# Altium footprint library LAN Transformer.PcbLib: 66 footprints (part 3 of 5)
Each footprint in its own frame and in the unit in brackets; x right, y up, seen from the top. Pads: shape width x height; smd on the part's side, far side on the other; paste and mask are expansions set on the pad; w line width, h text height; cw(c..) or ccw(c..) is an arc to the next point about the centre after c.
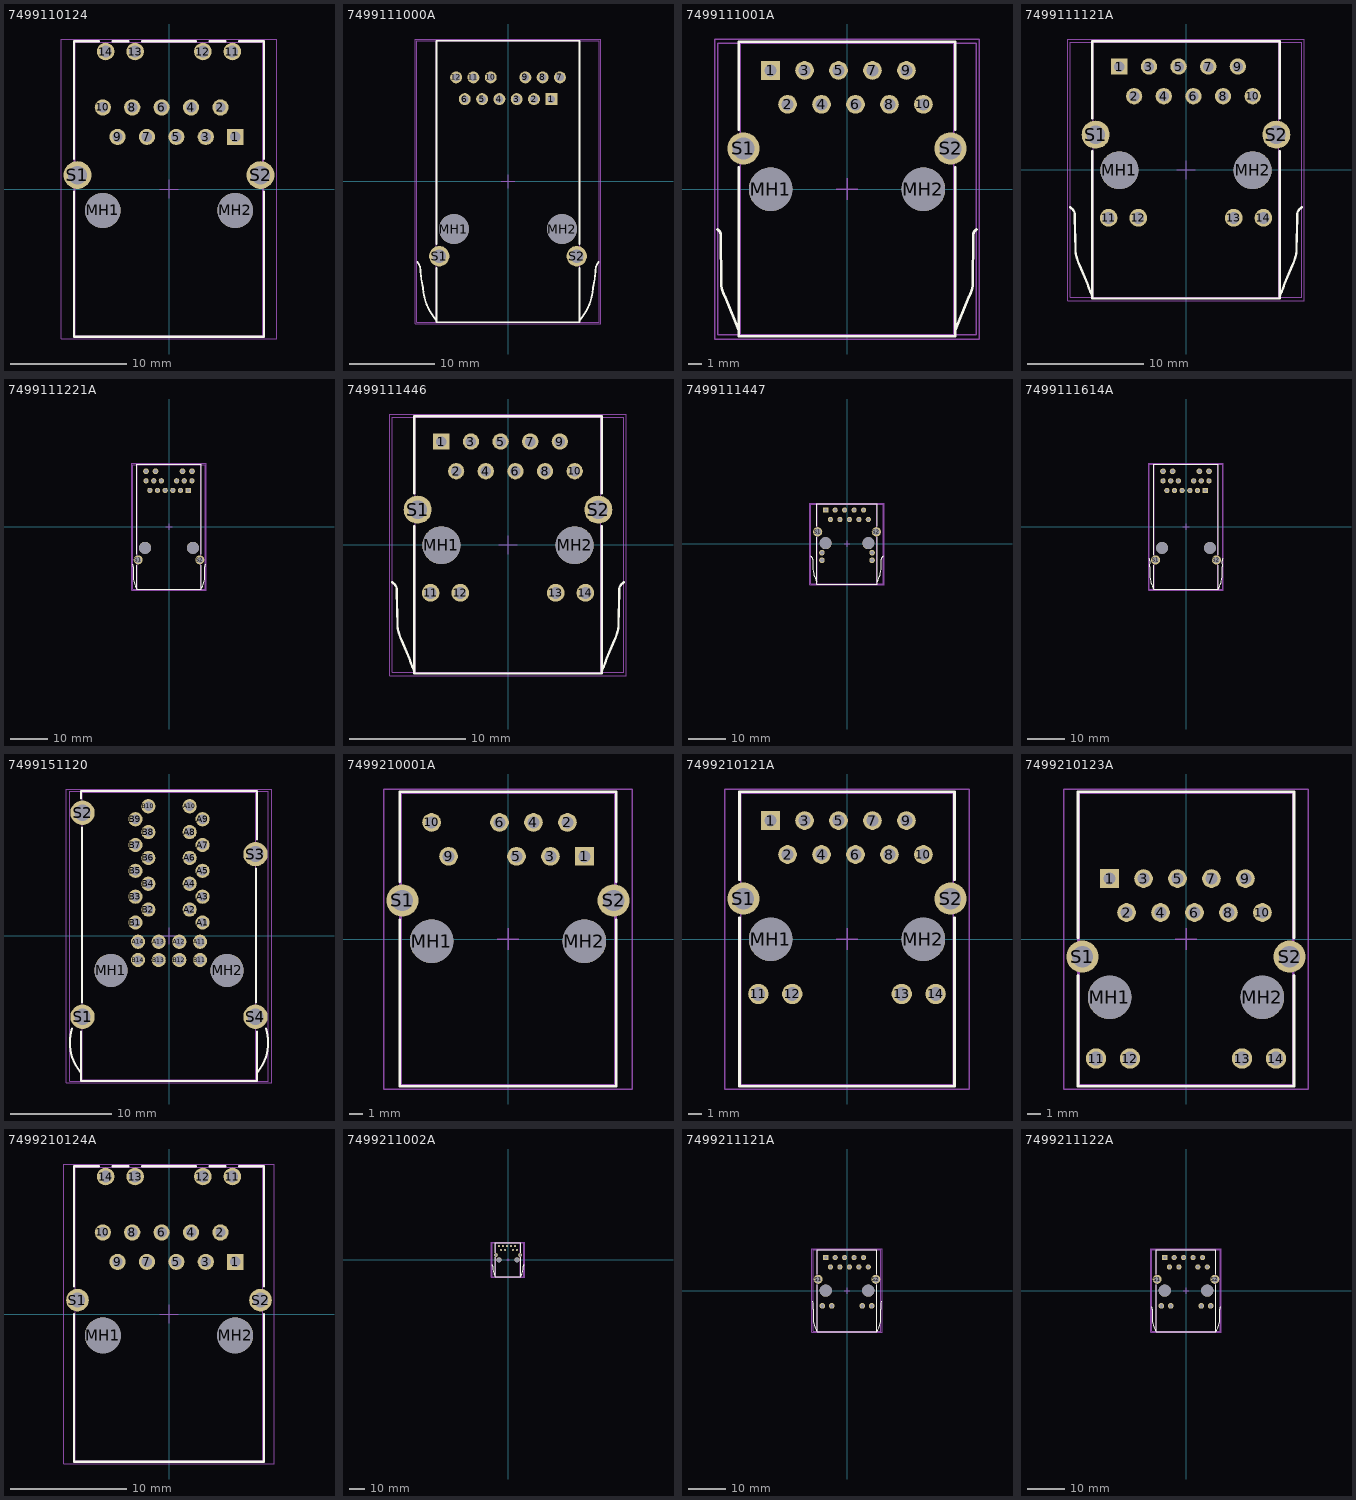
[diagram p2: the footprints below, top view; thin cyan lines are the x and y axes]

## 7499110124 [mm] "LAN Transformer, body 25.3x16.2mm"
height 13.5
pads (18):
  rect 1.4x1.4 hole 0.9: 1(5.715,4.5)
  round 1.4 hole 0.9: 2(4.445,7.04) 3(3.175,4.5) 4(1.905,7.04) 5(0.635,4.5) 6(-0.635,7.04) 7(-1.905,4.5) 8(-3.175,7.04) 9(-4.445,4.5) 10(-5.715,7.04)
  round 1.52 hole 1.02: 11(5.465,11.87) 12(2.925,11.87) 13(-2.925,11.87) 14(-5.465,11.87)
  round 3.05 hole 3.05 unplated: MH1(-5.715,-1.85) MH2(5.715,-1.85)
  round 2.4 hole 1.6: S1(-7.9,1.2) S2(7.9,1.2)
Top Overlay:
  lines w0.2: -8.2,-0.21 -8.2,-12.75 8.2,-12.75 8.2,-0.21 ; -8.2,2.62 -8.2,12.75 -6.06,12.75 ; -4.86,12.75 -3.53,12.75 ; -2.32,12.75 2.33,12.75 ; 3.53,12.75 4.86,12.75 ; 6.06,12.75 8.2,12.75 8.2,2.62
Mechanical 11:
  lines w0.1: -8.1,-12.65 8.1,-12.65 8.1,12.65 -8.1,12.65 -8.1,-12.65
  text ".Designator" at 0,0 h1
Mechanical 13:
  lines w0.1: -8.2,-12.65 -8.2,12.65 8.2,12.65 8.2,-12.65 -8.2,-12.65
Mechanical 15:
  lines w0.1: -0.8,0 0.8,0 ; 0,-0.8 0,0.8 ; -9.3,-12.95 -9.3,12.95 9.3,12.95 9.3,-12.95 -9.3,-12.95
3D body "7499110124.stp": height 13.6, standoff -3.45, extent -8.2,-12.65 8.2,12.65

## 7499111000A [mm] "LAN Transformer, body 33.02x16.79mm"
height 15.79
pads (16):
  rect 1.4x1.4 hole 0.89: 1(5.08,9.66)
  round 1.4 hole 0.89: 2(3.05,9.66) 3(1.02,9.66) 4(-1.01,9.66) 5(-3.04,9.66) 6(-5.07,9.66) 7(6.095,12.2) 8(4.065,12.2) 9(2.035,12.2) 10(-2.025,12.2) 11(-4.055,12.2) 12(-6.085,12.2)
  round 3.5 hole 3.5 unplated: MH1(-6.35,-5.58) MH2(6.35,-5.58)
  round 2.4 hole 1.57: S1(-8.065,-8.76) S2(8.065,-8.76)
Top Overlay:
  lines w0.2: -10.615,-9.424 cw(c-12,-10.49) -10.255,-10.589 ; -10.252,-10.486 -10.176,-11.433 -9.962,-12.498 ccw(c-3.6,-12.1) -8.395,-16.3 ; -8.395,-10.15 -8.395,-16.51 8.395,-16.51 8.395,-10.15 ; -8.395,-7.37 -8.395,16.51 8.395,16.51 8.395,-7.37 ; 8.395,-16.3 ccw(c3.6,-12.1) 9.962,-12.498 10.176,-11.433 10.252,-10.486 ; 10.255,-10.589 cw(c12,-10.49) 10.615,-9.424
Mechanical 11:
  lines w0.1: -8.395,-16.51 8.395,-16.51 8.395,16.51 -8.395,16.51 -8.395,-16.51
  text ".Designator" at 0,0 h1
Mechanical 13:
  lines w0.1: -10.695,-16.51 -10.695,16.51 10.695,16.51 10.695,-16.51 -10.695,-16.51
Mechanical 15:
  lines w0.1: -0.8,0 0.8,0 ; 0,-0.8 0,0.8 ; -10.895,-16.71 -10.895,16.71 10.895,16.71 10.895,-16.71 -10.895,-16.71
3D body "7499111000A.stp": height 16.85, standoff -3.45, extent -10.695,-16.51 10.695,16.51

## 7499111001A [mm] "LAN Transformer, body 21.84x16mm"
height 13.95
pads (14):
  rect 1.4x1.4 hole 0.89: 1(-5.715,8.87)
  round 1.4 hole 0.89: 2(-4.445,6.33) 3(-3.175,8.87) 4(-1.905,6.33) 5(-0.635,8.87) 6(0.635,6.33) 7(1.905,8.87) 8(3.175,6.33) 9(4.445,8.87) 10(5.715,6.33)
  round 3.25 hole 3.25 unplated: MH1(-5.715,-0.02) MH2(5.715,-0.02)
  round 2.4 hole 1.63: S1(-7.745,3.03) S2(7.745,3.03)
Top Overlay:
  lines w0.2: -9.683,-3.029 cw(c-9.92,-3.45) -9.437,-3.45 ; -9.44,-3.4 -9.398,-7.215 ; -9.405,-7.216 ccw(c-6.777,-6.794) -9.108,-8.079 -8.104,-10.562 ; -8.1,1.63 -8.1,-11.02 8.1,-11.02 8.1,1.63 ; -8.1,4.44 -8.1,11.02 8.1,11.02 8.1,4.44 ; 8.104,-10.562 9.108,-8.079 ccw(c6.777,-6.794) 9.405,-7.216 ; 9.398,-7.215 9.44,-3.4 ; 9.437,-3.45 cw(c9.92,-3.45) 9.683,-3.029
Mechanical 11:
  lines w0.1: -8,-10.92 8,-10.92 8,10.92 -8,10.92 -8,-10.92
  text ".Designator" at 0,0 h1
Mechanical 13:
  lines w0.1: -9.671,-10.92 -9.671,10.92 9.671,10.92 9.671,-10.92 -9.671,-10.92
Mechanical 15:
  lines w0.1: -0.8,0 0.8,0 ; 0,-0.8 0,0.8 ; -9.9,-11.22 -9.9,11.22 9.9,11.22 9.9,-11.22 -9.9,-11.22
3D body "7499111001A.stp": height 15.8, standoff -3.66, extent -9.671,-10.94 9.671,10.9

## 7499111121A [mm] "LAN Transformer, body 21.84x15.88mm"
height 13.95
pads (18):
  rect 1.4x1.4 hole 0.9: 1(-5.715,8.86)
  round 1.4 hole 0.9: 2(-4.445,6.32) 3(-3.175,8.86) 4(-1.905,6.32) 5(-0.635,8.86) 6(0.635,6.32) 7(1.905,8.86) 8(3.175,6.32) 9(4.445,8.86) 10(5.715,6.32)
  round 1.52 hole 1.02: 11(-6.63,-4.11) 12(-4.09,-4.11) 13(4.09,-4.11) 14(6.63,-4.11)
  round 3.25 hole 3.25 unplated: MH1(-5.715,-0.03) MH2(5.715,-0.03)
  round 2.4 hole 1.6: S1(-7.745,3.02) S2(7.745,3.02)
Top Overlay:
  lines w0.2: -9.93,-3.209 cw(c-10.325,-3.901) -9.528,-3.901 -9.47,-7 ccw(c-8.2,-7) -9.37,-7.494 ccw(c-6.9,-7) -9.112,-8.205 -8.445,-9.764 ccw(c-2.1,-7.88) -8.04,-10.8 ; -8.04,1.6 -8.04,-11.02 8.04,-11.02 8.04,1.6 ; -8.04,4.44 -8.04,11.02 8.04,11.02 8.04,4.44 ; 8.04,-10.8 ccw(c2.1,-7.88) 8.445,-9.764 9.112,-8.205 ccw(c6.9,-7) 9.37,-7.494 ccw(c8.2,-7) 9.47,-7 9.528,-3.901 cw(c10.325,-3.901) 9.93,-3.209
Mechanical 11:
  lines w0.1: -7.94,-10.92 -7.94,10.92 7.94,10.92 7.94,-10.92 -7.94,-10.92
  text ".Designator" at 0,0 h1
Mechanical 13:
  lines w0.1: -9.923,-10.92 9.923,-10.92 9.923,10.92 -9.923,10.92 -9.923,-10.92
Mechanical 15:
  lines w0.1: -0.8,0 0.8,0 ; 0,-0.8 0,0.8 ; -10.13,-11.22 10.13,-11.22 10.13,11.22 -10.13,11.22 -10.13,-11.22
3D body "7499111121A.stp": height 16.01, standoff -3.57, extent -9.923,-10.92 9.923,10.92

## 7499111221A [mm] "LAN Transformer, body 33.02x16.79mm"
height 15.79
pads (20):
  rect 1.4x1.4 hole 0.89: 1(5.075,9.66)
  round 1.4 hole 0.89: 2(3.045,9.66) 3(1.015,9.66) 4(-1.015,9.66) 5(-3.045,9.66) 6(-5.075,9.66) 7(6.085,12.2) 8(4.055,12.2) 9(2.025,12.2) 10(-2.025,12.2) 11(-4.055,12.2) 12(-6.085,12.2)
  round 1.53 hole 1.03: 13(6.12,14.74) 14(3.58,14.74) 15(-3.58,14.74) 16(-6.12,14.74)
  round 3.2 hole 3.2 unplated: MH1(-6.35,-5.58) MH2(6.35,-5.58)
  round 2.4 hole 1.57: S1(-8.175,-8.76) S2(8.175,-8.76)
Top Overlay:
  lines w0.2: -9.664,-9.913 cw(c-10.775,-10.525) -9.508,-10.582 ccw(c-5.893,-11.022) -9.535,-11.052 ccw(c15.129,-11.88) -9.464,-13.924 ccw(c-1.045,-12.405) -8.495,-16.61 ; -8.495,-10.17 -8.495,-16.61 ; -8.495,-7.35 -8.495,16.61 8.495,16.61 8.495,-7.35 ; 8.495,-10.17 8.495,-16.61 ; 9.664,-9.913 ccw(c10.775,-10.525) 9.508,-10.582 cw(c5.893,-11.022) 9.535,-11.052 cw(c-15.129,-11.88) 9.464,-13.924 cw(c1.045,-12.405) 8.495,-16.61 ; -8.495,-16.61 8.495,-16.61
Mechanical 11:
  lines w0.1: -8.395,-16.51 8.395,-16.51 8.395,16.51 -8.395,16.51 -8.395,-16.51
  text ".Designator" at 0,0 h1
Mechanical 13:
  lines w0.1: -9.685,-16.51 -9.685,16.51 9.685,16.51 9.685,-16.51 -9.685,-16.51
Mechanical 15:
  lines w0.1: -0.8,0 0.8,0 ; 0,-0.8 0,0.8 ; -9.9,-16.81 9.9,-16.81 9.9,16.81 -9.9,16.81 -9.9,-16.81
3D body "7499111221A.stp": height 16.02, standoff -3.49, extent -9.685,-16.51 9.685,16.51

## 7499111446 [mm] "LAN Transformer, body 21.84x15.88mm"
height 13.95
pads (18):
  rect 1.4x1.4 hole 0.9: 1(-5.715,8.86)
  round 1.4 hole 0.9: 2(-4.445,6.32) 3(-3.175,8.86) 4(-1.905,6.32) 5(-0.635,8.86) 6(0.635,6.32) 7(1.905,8.86) 8(3.175,6.32) 9(4.445,8.86) 10(5.715,6.32)
  round 1.52 hole 1.02: 11(-6.63,-4.11) 12(-4.09,-4.11) 13(4.09,-4.11) 14(6.63,-4.11)
  round 3.25 hole 3.25 unplated: MH1(-5.715,-0.03) MH2(5.715,-0.03)
  round 2.4 hole 1.6: S1(-7.745,3.02) S2(7.745,3.02)
Top Overlay:
  lines w0.2: -9.93,-3.209 cw(c-10.325,-3.901) -9.528,-3.901 -9.47,-7 ccw(c-8.2,-7) -9.37,-7.494 ccw(c-6.9,-7) -9.112,-8.205 -8.445,-9.764 ccw(c-2.1,-7.88) -8.04,-10.8 ; -8.04,1.61 -8.04,-11.02 8.04,-11.02 8.04,1.61 ; -8.04,4.44 -8.04,11.02 8.04,11.02 8.04,4.44 ; 8.04,-10.8 ccw(c2.1,-7.88) 8.445,-9.764 9.112,-8.205 ccw(c6.9,-7) 9.37,-7.494 ccw(c8.2,-7) 9.47,-7 9.528,-3.901 cw(c10.325,-3.901) 9.93,-3.209
Mechanical 11:
  lines w0.1: -7.94,-10.92 -7.94,10.92 7.94,10.92 7.94,-10.92 -7.94,-10.92
  text ".Designator" at 0,0 h1
Mechanical 13:
  lines w0.1: -9.923,-10.92 9.923,-10.92 9.923,10.92 -9.923,10.92 -9.923,-10.92
Mechanical 15:
  lines w0.1: -0.8,0 0.8,0 ; 0,-0.8 0,0.8 ; -10.13,-11.22 -10.13,11.22 10.13,11.22 10.13,-11.22 -10.13,-11.22
3D body "7499111446.stp": height 16.01, standoff -3.52, extent -9.923,-10.92 9.923,10.92

## 7499111447 [mm] "LAN Transformer, body 21.3x16mm"
height 13.55
pads (18):
  rect 1.4x1.4 hole 0.89: 1(-5.715,9.09)
  round 1.4 hole 0.89: 2(-4.445,6.55) 3(-3.175,9.09) 4(-1.905,6.55) 5(-0.635,9.09) 6(0.635,6.55) 7(1.905,9.09) 8(3.175,6.55) 9(4.445,9.09) 10(5.715,6.55)
  round 1.52 hole 1.02: 11(-6.725,-2.34) 12(-6.725,-4.37) 13(6.725,-2.34) 14(6.725,-4.37)
  round 3.2 hole 3.2 unplated: MH1(-5.715,0.2) MH2(5.715,0.2)
  round 2.5 hole 1.7: S1(-7.875,3.25) S2(7.875,3.25)
Top Overlay:
  lines w0.2: -9.783,-3.331 cw(c-10,-4.2) -9.104,-4.2 ; -9.113,-4.072 ccw(c-5.498,-4.512) -9.14,-4.542 ccw(c15.524,-5.37) -9.069,-7.414 ccw(c-0.65,-5.895) -8.1,-10.1 ; -8.1,1.78 -8.1,-10.75 8.1,-10.75 8.1,1.78 ; -8.1,4.73 -8.1,10.75 8.1,10.75 8.1,4.73 ; 8.1,-10.1 ccw(c0.65,-5.895) 9.069,-7.414 ccw(c-15.524,-5.37) 9.14,-4.542 ccw(c5.498,-4.512) 9.113,-4.072 ; 9.104,-4.2 cw(c10,-4.2) 9.783,-3.331
Mechanical 11:
  lines w0.1: -8,-10.65 -8,10.65 8,10.65 8,-10.65 -8,-10.65
  text ".Designator" at 0,0 h1
Mechanical 13:
  lines w0.1: -9.724,-10.65 9.724,-10.65 9.724,10.65 -9.724,10.65 -9.724,-10.65
Mechanical 15:
  lines w0.1: -0.8,0 0.8,0 ; 0,-0.8 0,0.8 ; -10,-10.95 10,-10.95 10,10.95 -10,10.95 -10,-10.95
3D body "7499111447.stp": height 15.35, standoff -2.98, extent -9.724,-10.65 9.724,10.65

## 7499111614A [mm] "LAN Transformer, body 33.02x16.87mm"
height 13.87
pads (20):
  rect 1.4x1.4 hole 0.9: 1(5.075,9.62)
  round 1.4 hole 0.9: 2(3.045,9.62) 3(1.015,9.62) 4(-1.015,9.62) 5(-3.045,9.62) 6(-5.075,9.62) 7(6.085,12.16) 8(4.055,12.16) 9(2.025,12.16) 10(-2.025,12.16) 11(-4.055,12.16) 12(-6.085,12.16)
  round 1.52 hole 1.02: 13(6.09,14.7) 14(3.55,14.7) 15(-3.55,14.7) 16(-6.09,14.7)
  round 3.15 hole 3.15 unplated: MH1(-6.35,-5.62) MH2(6.35,-5.62)
  round 2.4 hole 1.6: S1(-8.065,-8.8) S2(8.065,-8.8)
Top Overlay:
  lines w0.2: -9.697,-8.501 cw(c-10.808,-9.113) -9.541,-9.17 -9.548,-10.582 ccw(c-5.933,-11.022) -9.575,-11.052 ccw(c15.089,-11.88) -9.504,-13.924 ccw(c-1.085,-12.405) -8.535,-16.61 ; -8.535,-10.18 -8.535,-16.61 ; -8.535,-7.42 -8.535,16.61 8.535,16.61 8.535,-7.42 ; 8.535,-10.18 8.535,-16.61 ; 9.697,-8.501 ccw(c10.808,-9.113) 9.541,-9.17 9.548,-10.582 cw(c5.933,-11.022) 9.575,-11.052 cw(c-15.089,-11.88) 9.504,-13.924 cw(c1.085,-12.405) 8.535,-16.61 ; -8.535,-16.61 8.535,-16.61
Mechanical 11:
  lines w0.1: -8.435,-16.51 -8.435,16.51 8.435,16.51 8.435,-16.51 -8.435,-16.51
  text ".Designator" at 0,0 h1
Mechanical 13:
  lines w0.1: -9.685,-16.51 9.685,-16.51 9.685,16.51 -9.685,16.51 -9.685,-16.51
Mechanical 15:
  lines w0.1: -0.8,0 0.8,0 ; 0,-0.8 0,0.8 ; -9.9,-16.81 -9.9,16.81 9.9,16.81 9.9,-16.81 -9.9,-16.81
3D body "7499111614A.stp": height 15.86, standoff -3.44, extent -9.685,-16.51 9.685,16.51

## 7499151120 [mm] "LAN Transformer, body 28.3x17.09mm"
height 25.25
pads (34):
  round 1.4 hole 0.9: A1(3.3,1.32) A2(2.03,2.59) A3(3.3,3.86) A4(2.03,5.13) A5(3.3,6.4) A6(2.03,7.67) A7(3.3,8.94) A8(2.03,10.21) A9(3.3,11.48) A10(2.03,12.75) A11(3.045,-0.57) A12(1.015,-0.57) A13(-1.015,-0.57) A14(-3.045,-0.57) B1(-3.3,1.32) B2(-2.03,2.59) B3(-3.3,3.86) B4(-2.03,5.13) B5(-3.3,6.4) B6(-2.03,7.67) B7(-3.3,8.94) B8(-2.03,10.21) B9(-3.3,11.48) B10(-2.03,12.75) B11(3.045,-2.37) B12(1.015,-2.37) B13(-1.015,-2.37) B14(-3.045,-2.37)
  round 3.25 hole 3.25 unplated: MH1(-5.715,-3.38) MH2(5.715,-3.38)
  round 2.4 hole 1.6: S1(-8.505,-7.95) S2(-8.505,12.11) S3(8.505,8.05) S4(8.505,-7.95)
Top Overlay:
  lines w0.2: -9.551,-9.089 ccw(c-5.155,-10.45) -8.645,-13.45 ; -8.645,-9.38 -8.645,-14.25 8.645,-14.25 8.645,-9.38 ; -8.645,13.54 -8.645,14.25 8.645,14.25 8.645,9.48 ; -8.545,-6.52 -8.545,10.67 ; 8.545,-6.52 8.545,6.62 ; 8.645,-13.45 ccw(c5.155,-10.45) 9.551,-9.089
Mechanical 11:
  lines w0.1: -8.545,-14.15 -8.545,14.15 8.545,14.15 8.545,-14.15 -8.545,-14.15
  text ".Designator" at 0,0 h1
Mechanical 13:
  lines w0.1: -9.744,-14.27 9.744,-14.27 9.744,14.231 -9.744,14.231 -9.744,-14.27
Mechanical 15:
  lines w0.1: -0.8,0 0.8,0 ; 0,-0.8 0,0.8 ; -10.1,-14.45 -10.1,14.45 10.1,14.45 10.1,-14.45 -10.1,-14.45
3D body "7499151120.stp": height 26.5, standoff -3.8, extent -9.744,-14.27 9.744,14.231

## 7499210001A [mm] "LAN Transformer, body 21.84x16mm"
height 13.74
pads (12):
  rect 1.4x1.4 hole 0.89: 1(5.715,6.18)
  round 1.4 hole 0.89: 2(4.445,8.72) 3(3.175,6.18) 4(1.905,8.72) 5(0.635,6.18) 6(-0.635,8.72) 9(-4.445,6.18) 10(-5.715,8.72)
  round 3.25 hole 3.25 unplated: MH1(-5.715,-0.17) MH2(5.715,-0.17)
  round 2.4 hole 1.6: S1(-7.9,2.88) S2(7.9,2.88)
Top Overlay:
  lines w0.2: -8.1,1.45 -8.1,-11.02 8.1,-11.02 8.1,1.45 ; -8.1,4.3 -8.1,11.02 8.1,11.02 8.1,4.3
Mechanical 11:
  lines w0.1: -8,-10.92 -8,10.92 8,10.92 8,-10.92 -8,-10.92
  text ".Designator" at 0,0 h1
Mechanical 13:
  lines w0.1: -8.1,-10.92 -8.1,10.92 8.1,10.92 8.1,-10.92 -8.1,-10.92
Mechanical 15:
  lines w0.1: -0.8,0 0.8,0 ; 0,-0.8 0,0.8 ; -9.3,-11.22 -9.3,11.22 9.3,11.22 9.3,-11.22 -9.3,-11.22
3D body "7499210001A.stp": height 13.87, standoff -2.86, extent -8.1,-10.92 8.1,10.92

## 7499210121A [mm] "LAN Transformer, body 21.84x15.88mm"
height 13.95
pads (18):
  rect 1.4x1.4 hole 0.9: 1(-5.715,8.86)
  round 1.4 hole 0.9: 2(-4.445,6.32) 3(-3.175,8.86) 4(-1.905,6.32) 5(-0.635,8.86) 6(0.635,6.32) 7(1.905,8.86) 8(3.175,6.32) 9(4.445,8.86) 10(5.715,6.32)
  round 1.52 hole 1.02: 11(-6.63,-4.11) 12(-4.09,-4.11) 13(4.09,-4.11) 14(6.63,-4.11)
  round 3.25 hole 3.25 unplated: MH1(-5.715,-0.03) MH2(5.715,-0.03)
  round 2.4 hole 1.6: S1(-7.745,3.02) S2(7.745,3.02)
Top Overlay:
  lines w0.2: -8.04,1.6 -8.04,-11.02 8.04,-11.02 8.04,1.6 ; -8.04,4.44 -8.04,11.02 8.04,11.02 8.04,4.44
Mechanical 11:
  lines w0.1: -7.94,-10.92 -7.94,10.92 7.94,10.92 7.94,-10.92 -7.94,-10.92
  text ".Designator" at 0,0 h1
Mechanical 13:
  lines w0.1: -7.94,-10.92 7.94,-10.92 7.94,10.92 -7.94,10.92 -7.94,-10.92
Mechanical 15:
  lines w0.1: -0.8,0 0.8,0 ; 0,-0.8 0,0.8 ; -9.145,-11.22 9.145,-11.22 9.145,11.22 -9.145,11.22 -9.145,-11.22
3D body "7499210121A.stp": height 14.08, standoff -4.05, extent -7.94,-10.92 7.94,10.92

## 7499210123A [mm] "LAN Transformer, body 21.84x15.95mm"
height 16.9
pads (18):
  rect 1.4x1.4 hole 0.9: 1(-5.715,4.52)
  round 1.4 hole 0.9: 2(-4.445,1.98) 3(-3.175,4.52) 4(-1.905,1.98) 5(-0.635,4.52) 6(0.635,1.98) 7(1.905,4.52) 8(3.175,1.98) 9(4.445,4.52) 10(5.715,1.98)
  round 1.52 hole 1.02: 11(-6.73,-8.94) 12(-4.19,-8.94) 13(4.19,-8.94) 14(6.73,-8.94)
  round 3.25 hole 3.25 unplated: MH1(-5.715,-4.37) MH2(5.715,-4.37)
  round 2.4 hole 1.6: S1(-7.745,-1.32) S2(7.745,-1.32)
Top Overlay:
  lines w0.2: -8.075,-2.73 -8.075,-11.02 8.075,-11.02 8.075,-2.73 ; -8.075,0.09 -8.075,11.02 8.075,11.02 8.075,0.09
Mechanical 11:
  lines w0.1: -7.975,-10.92 7.975,-10.92 7.975,10.92 -7.975,10.92 -7.975,-10.92
  text ".Designator" at 0,0 h1
Mechanical 13:
  lines w0.1: -8.1,-10.92 8.075,-10.92 8.075,10.92 -8.1,10.92 -8.1,-10.92
Mechanical 15:
  lines w0.1: -0.8,0 0.8,0 ; 0,-0.8 0,0.8 ; -9.145,-11.22 -9.145,11.22 9.145,11.22 9.145,-11.22 -9.145,-11.22
3D body "7499210123A.stp": height 16.87, standoff -3.32, extent -8.1,-10.92 8.1,10.92

## 7499210124A [mm] "LAN Transformer, body 25.3x16.2mm"
height 13.5
pads (18):
  rect 1.4x1.4 hole 0.9: 1(5.715,4.5)
  round 1.4 hole 0.9: 2(4.445,7.04) 3(3.175,4.5) 4(1.905,7.04) 5(0.635,4.5) 6(-0.635,7.04) 7(-1.905,4.5) 8(-3.175,7.04) 9(-4.445,4.5) 10(-5.715,7.04)
  round 1.52 hole 1.02: 11(5.465,11.87) 12(2.925,11.87) 13(-2.925,11.87) 14(-5.465,11.87)
  round 3.1 hole 3.1 unplated: MH1(-5.715,-1.85) MH2(5.715,-1.85)
  round 1.95 hole 1.3: S1(-7.9,1.2) S2(7.9,1.2)
Top Overlay:
  lines w0.2: -8.2,0 -8.2,-12.75 8.2,-12.75 8.2,0 ; -8.2,2.39 -8.2,12.75 -6.07,12.75 ; -4.86,12.75 -3.53,12.75 ; -2.31,12.75 2.32,12.75 ; 3.53,12.75 4.86,12.75 ; 6.07,12.75 8.2,12.75 8.2,2.39
Mechanical 11:
  lines w0.1: -8.1,-12.65 8.1,-12.65 8.1,12.65 -8.1,12.65 -8.1,-12.65
  text ".Designator" at 0,0 h1
Mechanical 13:
  lines w0.1: -8.1,-12.65 -8.1,12.65 8.1,12.65 8.1,-12.65 -8.1,-12.65
Mechanical 15:
  lines w0.1: -0.8,0 0.8,0 ; 0,-0.8 0,0.8 ; -9.075,-12.95 9.075,-12.95 9.075,12.95 -9.075,12.95 -9.075,-12.95
3D body "7499210124A.stp": height 13.65, standoff -3.34, extent -8.1,-12.65 8.1,12.65

## 7499211002A [mm] "LAN Transformer, body 21.84x15.88mm"
height 13.74
pads (13):
  rect 1.4x1.4 hole 0.9: 1(-5.715,8.86)
  round 1.4 hole 0.9: 2(-4.445,6.32) 3(-3.175,8.86) 4(-1.905,6.32) 5(-0.635,8.86) 7(1.905,8.86) 8(3.175,6.32) 9(4.445,8.86) 10(5.715,6.32)
  round 3.25 hole 3.25 unplated: MH1(-5.715,-0.03) MH2(5.715,-0.03)
  round 2.4 hole 1.6: S1(-7.74,3.02) S2(7.74,3.02)
Top Overlay:
  lines w0.2: -10.107,-3.368 cw(c-10.465,-3.995) -9.751,-4.096 ccw(c2.96,-5.12) -9.709,-6.573 ccw(c4.524,-3.711) -8.849,-9.362 cw(c-48.855,-34.82) -8.251,-10.328 cw(c-9.438,-11.219) -8.04,-10.72 ; -8.04,1.61 -8.04,-11.02 8.04,-11.02 8.04,1.61 ; -8.04,4.43 -8.04,11.02 8.04,11.02 8.04,4.43 ; 8.04,-10.72 cw(c9.438,-11.219) 8.251,-10.328 cw(c48.855,-34.82) 8.849,-9.362 ccw(c-4.524,-3.711) 9.709,-6.573 ccw(c-2.96,-5.12) 9.751,-4.096 cw(c10.465,-3.995) 10.107,-3.368
Mechanical 11:
  lines w0.1: -7.94,-10.92 7.94,-10.92 7.94,10.92 -7.94,10.92 -7.94,-10.92
  text ".Designator" at 0,0 h1
Mechanical 13:
  lines w0.1: -10.14,-10.92 -10.14,10.92 10.14,10.92 10.14,-10.92 -10.14,-10.92
Mechanical 15:
  lines w0.1: -0.8,0 0.8,0 ; 0,-0.8 0,0.8 ; -10.81,-11.22 -10.81,11.22 10.81,11.22 10.81,-11.22 -10.81,-11.22
3D body "7499211002A.stp": height 16.02, standoff -3.35, extent -10.14,-10.92 10.14,10.92

## 7499211121A [mm] "LAN Transformer, body 21.84x15.88mm"
height 13.95
pads (18):
  rect 1.4x1.4 hole 0.9: 1(-5.715,8.86)
  round 1.4 hole 0.9: 2(-4.445,6.32) 3(-3.175,8.86) 4(-1.905,6.32) 5(-0.635,8.86) 6(0.635,6.32) 7(1.905,8.86) 8(3.175,6.32) 9(4.445,8.86) 10(5.715,6.32)
  round 1.52 hole 1.02: 11(-6.63,-4.11) 12(-4.09,-4.11) 13(4.09,-4.11) 14(6.63,-4.11)
  round 3.25 hole 3.25 unplated: MH1(-5.715,-0.03) MH2(5.715,-0.03)
  round 2.4 hole 1.6: S1(-7.745,3.02) S2(7.745,3.02)
Top Overlay:
  lines w0.2: -9.202,-2.911 cw(c-10.313,-3.523) -9.046,-3.58 -9.053,-4.992 ccw(c-5.438,-5.432) -9.08,-5.462 ccw(c15.584,-6.29) -9.009,-8.334 ccw(c-0.59,-6.815) -8.04,-11.02 ; -8.04,1.61 -8.04,-11.02 ; -8.04,4.44 -8.04,11.02 8.04,11.02 8.04,4.44 ; 8.04,1.61 8.04,-11.02 ; 9.202,-2.911 ccw(c10.313,-3.523) 9.046,-3.58 9.053,-4.992 cw(c5.438,-5.432) 9.08,-5.462 cw(c-15.584,-6.29) 9.009,-8.334 cw(c0.59,-6.815) 8.04,-11.02 ; -8.04,-11.02 8.04,-11.02
Mechanical 11:
  lines w0.1: -7.94,-10.92 7.94,-10.92 7.94,10.92 -7.94,10.92 -7.94,-10.92
  text ".Designator" at 0,0 h1
Mechanical 13:
  lines w0.1: -9.111,-10.92 -9.111,10.92 9.111,10.92 9.111,-10.92 -9.111,-10.92
Mechanical 15:
  lines w0.1: -0.8,0 0.8,0 ; 0,-0.8 0,0.8 ; -9.402,-11.22 -9.402,11.22 9.402,11.22 9.402,-11.22 -9.402,-11.22
3D body "7499211121A.stp": height 15.79, standoff -3.37, extent -9.111,-10.92 9.111,10.92

## 7499211122A [mm] "LAN Transformer, body 21.84x15.88mm"
height 13.74
pads (17):
  rect 1.4x1.4 hole 0.9: 1(-5.715,8.86)
  round 1.4 hole 0.9: 2(-4.445,6.32) 3(-3.175,8.86) 4(-1.905,6.32) 5(-0.635,8.86) 7(1.905,8.86) 8(3.175,6.32) 9(4.445,8.86) 10(5.715,6.32)
  round 1.52 hole 1.02: 11(-6.63,-4.11) 12(-4.09,-4.11) 13(4.09,-4.11) 14(6.63,-4.11)
  round 3.25 hole 3.25 unplated: MH1(-5.715,-0.03) MH2(5.715,-0.03)
  round 2.4 hole 1.6: S1(-7.745,3.02) S2(7.745,3.02)
Top Overlay:
  lines w0.2: -9.209,-4.323 cw(c-10.32,-4.935) -9.053,-4.992 ccw(c-5.438,-5.432) -9.08,-5.462 ccw(c15.584,-6.29) -9.009,-8.334 ccw(c-0.59,-6.815) -8.04,-11.02 ; -8.04,1.61 -8.04,-11.02 ; -8.04,4.44 -8.04,11.02 8.04,11.02 8.04,4.44 ; 8.04,1.61 8.04,-11.02 ; 9.209,-4.323 ccw(c10.32,-4.935) 9.053,-4.992 cw(c5.438,-5.432) 9.08,-5.462 cw(c-15.584,-6.29) 9.009,-8.334 cw(c0.59,-6.815) 8.04,-11.02 ; -8.04,-11.02 8.04,-11.02
Mechanical 11:
  lines w0.1: -7.94,-10.92 -7.94,10.92 7.94,10.92 7.94,-10.92 -7.94,-10.92
  text ".Designator" at 0,0 h1
Mechanical 13:
  lines w0.1: -9.163,-10.92 9.163,-10.92 9.163,10.92 -9.163,10.92 -9.163,-10.92
Mechanical 15:
  lines w0.1: -0.8,0 0.8,0 ; 0,-0.8 0,0.8 ; -9.41,-11.22 9.41,-11.22 9.41,11.22 -9.41,11.22 -9.41,-11.22
3D body "7499211122A.stp": height 15.24, standoff -3.32, extent -9.163,-10.92 9.163,10.92